# Altium footprint library Sensor.PcbLib: 18 footprints (part 1 of 2)
Each footprint in its own frame and in the unit in brackets; x right, y up, seen from the top. Pads: shape width x height; smd on the part's side, far side on the other; paste and mask are expansions set on the pad; w line width, h text height; cw(c..) or ccw(c..) is an arc to the next point about the centre after c.
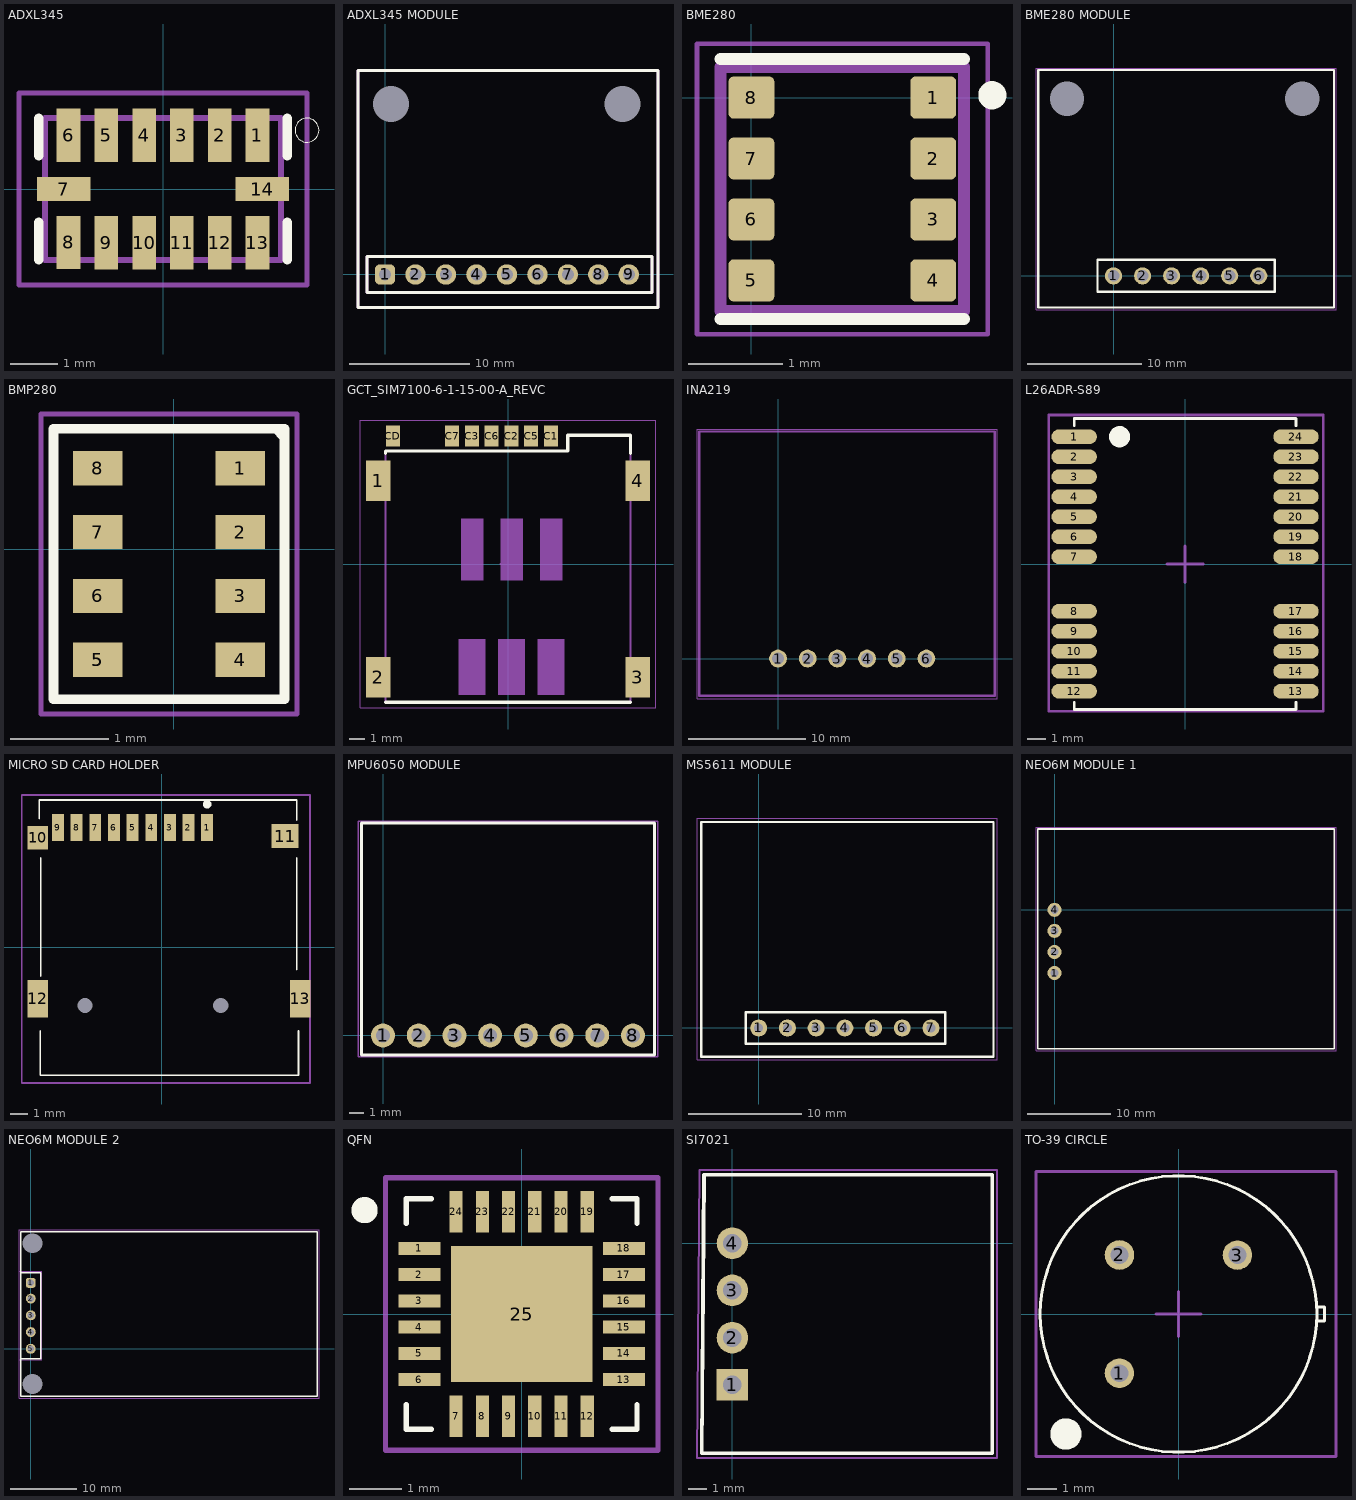
[diagram p0: the footprints below, top view; thin cyan lines are the x and y axes]

## ADXL345 [mm]
pads (14):
  rect 0.5x1.124 smd: 1(2,1.138) 2(1.2,1.138) 3(0.4,1.138) 4(-0.4,1.138) 5(-1.2,1.138) 6(-2,1.138) 8(-2,-1.13) 9(-1.2,-1.138) 10(-0.4,-1.138) 11(0.4,-1.138) 12(1.2,-1.138) 13(2,-1.138)
  rect 1.124x0.5 smd: 7(-2.1,0) 14(2.1,0)
Top Overlay:
  circle w0: c3.048,1.245 r0.254
  lines w0.203: -2.627,-1.5 -2.627,-0.7 ; -2.627,0.7 -2.627,1.5 ; 2.627,-1.5 2.627,-0.7 ; 2.627,0.7 2.627,1.5
Mechanical 3:
  lines w0.1: -3.048,-2.032 3.048,-2.032 3.048,2.032 -3.048,2.032 -3.048,-2.032
Mechanical 13:
  lines w0.127: -2.5,-1.5 2.5,-1.5 2.5,1.5 -2.5,1.5 -2.5,-1.5
3D body "User Library-ADXL345.step": height 1, standoff 0, extent -2.5,-1.5 2.5,1.5

## ADXL345 MODULE [mm]
pads (11):
  rrect50% 1.7x1.7 hole 1 mask+0.102: 1(0,0)
  round 1.7 hole 1 mask+0.102: 2(2.54,0) 3(5.08,0) 4(7.62,0) 5(10.16,0) 6(12.7,0) 7(15.24,0) 8(17.78,0) 9(20.32,0)
  round 0 hole 3 mask+0.102: ""(0.508,14.224) ""(19.812,14.224)
Top Overlay:
  lines w0.254: -2.25,-2.75 -2.25,17 22.75,17 22.75,-2.75 -2.25,-2.75 ; -1.5,-1.5 22.25,-1.5 22.25,1.5 -1.5,1.5 -1.5,-1.5
Mechanical 3:
  lines w0.254: -2.25,-2.75 -2.25,17 -2,17 22.75,17 22.75,-2.75 -2.25,-2.75 ; -1.5,-1.5 4.437,-1.5 16.312,-1.5 22.25,-1.5 22.25,1.5 16.312,1.5 13.344,1.5 11.859,1.5 8.891,1.5 7.406,1.5 4.437,1.5 -1.5,1.5 -1.5,-1.5
3D body "ADXL345 Digital Accelerometer.step": height 6.17, standoff -5.43, extent -1.905,-2.286 22.225,16.764

## BME280 [mm]
pads (8):
  rrect25% 0.49x0.45 smd: 1(1.94,0) 2(1.94,-0.65) 3(1.94,-1.3) 4(1.94,-1.95) 5(0,-1.95) 6(0,-1.3) 7(0,-0.65) 8(0,0)
Top Overlay:
  circle w0.2: c2.57,0.025 r0.05
  lines w0.127: -0.33,-2.36 2.27,-2.36 ; -0.33,0.41 2.27,0.41
Mechanical 13:
  circle w0.2: c1.97,0.025 r0.05
  lines w0.127: -0.33,-2.275 -0.33,0.325 2.27,0.325 2.27,-2.275 -0.33,-2.275
Mechanical 15:
  lines w0.05: -0.58,-2.525 2.52,-2.525 2.52,0.575 -0.58,0.575 -0.58,-2.525
3D body "User Library-BME280-1.step": height 0.93, standoff 0, extent -0.285,-2.241 2.215,0.259

## BME280 MODULE [mm]
pads (8):
  round 1.5 hole 1: 1(0,0) 2(2.54,0) 3(5.08,0) 4(7.62,0) 5(10.16,0) 6(12.7,0)
  round 0 hole 3 mask+0.102: ""(-4.064,15.494)
  round 2.5 hole 3 mask+0.102: ""(16.51,15.494)
Top Overlay:
  lines w0.2: -1.397,-1.397 -1.397,1.397 14.097,1.397 14.097,-1.397 -1.372,-1.397 ; -6.579,-2.769 -6.579,18 19.279,18 19.279,-2.769 -6.579,-2.769
Mechanical 3:
  lines w0.1: -6.782,-2.972 -6.782,18.161 19.456,18.161 19.456,-2.972 -6.782,-2.972
3D body "Adafruit BNO055 STEMMA QT.step": height 7.9, standoff 3.3, extent -6.35,-2.54 19.05,17.78
3D body "BPSC-06.stp": height 6, standoff -5.54, extent -1.27,-1.27 13.97,1.27

## BMP280 [mm]
pads (9):
  rect 0.5x0.35 smd: 1(0.675,0.825) 2(0.675,0.175) 3(0.675,-0.475) 4(0.675,-1.125) 5(-0.775,-1.125) 5(-0.775,-1.125) 6(-0.775,-0.475) 7(-0.775,0.175) 8(-0.775,0.825)
Top Overlay:
  region: 1.125,1.225 0.995,1.225 0.984,1.214 1.107,1.09 1.122,1.09
  region: 1.123,1.157 1.123,1.223 1.125,1.225
  lines w0.1: -1.225,-1.525 -1.225,1.225 1.125,1.225 1.125,-1.525 0.537,-1.525 -0.637,-1.525 -1.225,-1.525
Mechanical 15:
  lines w0.05: -1.35,-1.675 1.25,-1.675 1.25,1.375 -1.35,1.375 -1.35,-1.675
3D body "BMP280.step": height 0.95, standoff -0.01, extent -1.05,-1.4 0.95,1.1

## GCT_SIM7100-6-1-15-00-A_REVC [mm]
pads (11):
  rect 1.56x2.61 smd: 1(-8.34,5.34) 2(-8.34,-7.29) 3(8.34,-7.29) 4(8.34,5.34)
  rect 0.9x1.35 smd: C1(2.755,8.215) C2(0.215,8.215) C3(-2.325,8.215) C5(1.485,8.215) C6(-1.055,8.215) C7(-3.595,8.215) CD(-7.405,8.215)
Top Overlay:
  lines w0.2: -7.875,-8.89 7.875,-8.89 ; -7.875,7.1 -7.875,7.27 3.84,7.27 3.84,8.28 7.875,8.28 7.875,7.1
Mechanical 13:
  lines w0.1: -7.875,-8.89 -7.875,7.27 3.84,7.27 3.84,8.28 7.875,8.28 7.875,-8.89 -7.875,-8.89
Mechanical 15:
  region: 0.935,-1.03 -0.465,-1.03 -0.465,2.91 0.935,2.91
  region: 3.625,-8.41 1.925,-8.41 1.925,-4.83 3.625,-4.83
  region: 3.475,-1.03 2.075,-1.03 2.075,2.91 3.475,2.91
  region: 1.085,-8.41 -0.615,-8.41 -0.615,-4.83 1.085,-4.83
  region: -1.455,-8.41 -3.155,-8.41 -3.155,-4.83 -1.455,-4.83
  region: -1.605,-1.03 -3.005,-1.03 -3.005,2.91 -1.605,2.91
  lines w0.05: -9.5,-9.25 -9.5,9.25 9.5,9.25 9.5,-9.25 -9.5,-9.25
  lines w0.1: -0.5,0 0.5,0 ; 0,-0.5 0,0.5
3D body "SIM7100-6-1-15-00-A--3DModel-STEP-56544.STEP": height 1.5, standoff -0.03, extent -8.406,-8.989 8.344,8.341

## INA219 [mil]
pads (6):
  round 60 hole 39.37: 1(0,0) 2(100,0) 3(200,0) 4(300,0) 5(400,0) 6(500,0)
Mechanical 3:
  lines w3.94: -273,-135 -273,772 738,772 738,-135 -273,-135
  lines w7.87: -265,-126 -265,765 730,765 730,-126 -265,-126
3D body "INA219.STEP": height 266.44, standoff -196.15, extent -260.13,-119 724.13,758.95

## L26ADR-S89 [mm]
pads (24):
  oval 2.5x0.8 smd paste-2: 1(-6.1,7) 2(-6.1,5.9) 3(-6.1,4.8) 4(-6.1,3.7) 5(-6.1,2.6) 6(-6.1,1.5) 7(-6.1,0.4) 8(-6.1,-2.6) 9(-6.1,-3.7) 10(-6.1,-4.8) 11(-6.1,-5.9) 12(-6.1,-7) 13(6.1,-7) 14(6.1,-5.9) 15(6.1,-4.8) 16(6.1,-3.7) 17(6.1,-2.6) 18(6.1,0.4) 19(6.1,1.5) 20(6.1,2.6) 21(6.1,3.7) 22(6.1,4.8) 23(6.1,5.9) 24(6.1,7)
Top Overlay:
  circle w0.6: c-3.6,7 r0.283
  lines w0.15: -6.1,-7.6 -6.1,-8 6.1,-8 6.1,-7.6 ; -6.1,7.6 -6.1,8 6.1,8 6.1,7.6
Top Component Center:
  lines w0.15: -1,0 1,0 ; 0,-1.016 0,0.984 ; -7.5,-8.1 7.6,-8.1 7.6,8.2 -7.5,8.2 -7.5,-8.1
Mechanical 15:
  lines w0.15: -7.5,-8.1 7.6,-8.1 7.6,8.2 -7.5,8.2 -7.5,-8.1
3D body "step_temp.STEP": height 2.35, standoff -0.05, extent -6.085,-7.995 6.115,8.005

## MICRO SD CARD HOLDER [mm]
pads (15):
  rect 0.7x1.6 smd paste+0 mask+0: 1(2.684,7.075) 2(1.584,7.075) 3(0.484,7.075) 4(-0.616,7.075) 5(-1.716,7.075) 6(-2.816,7.075) 7(-3.916,7.075) 8(-5.016,7.075) 9(-6.116,7.075)
  rect 1.2x1.4 smd paste+0 mask+0: 10(-7.316,6.475)
  rect 1.6x1.4 smd paste+0 mask+0: 11(7.284,6.575)
  rect 1.2x2.2 smd paste+0 mask+0: 12(-7.316,-3.025) 13(8.184,-3.025)
  round 0 hole 0.9 unplated paste-1000 mask+0: ""(-4.516,-3.425) ""(3.484,-3.425)
Top Overlay:
  circle w0.25: c2.684,8.45 r0.125
  lines w0.1: -7.225,7.6 -7.225,8.7 7.975,8.7 7.975,7.5 ; -7.157,-4.925 -7.157,-7.548 8.075,-7.548 8.075,-4.925 ; -7.125,-1.7 -7.125,5.3 ; 7.975,-1.3 7.975,5.3
Mechanical 3:
  lines w0.1: -8.25,-8 -8.25,9 -7.75,9 8.5,9 8.75,9 8.75,-8 -8.25,-8
3D body "User Library-MEM2055-00-190-01-A_revG.step": height 1.85, standoff -0.6, extent -7.567,-7.42 8.433,7.83

## MPU6050 MODULE [mm]
pads (8):
  round 1.7 hole 1 mask+0.102: 1(0,0) 2(2.54,0) 3(5.08,0) 4(7.62,0) 5(10.16,0) 6(12.7,0) 7(15.24,0) 8(17.78,0)
Top Overlay:
  lines w0.2: -1.524,-1.397 19.304,-1.397 19.304,15.113 -1.524,15.113 -1.524,-1.397
Mechanical 15:
  lines w0.1: -1.778,-1.524 19.558,-1.524 19.558,15.24 -1.778,15.24 -1.778,-1.524
3D body "Pin Header 1x8 TH Pitch 2.54mm.stp": height 6.5, standoff -6.2, extent -1.259,-1.237 19.061,1.303
3D body "MPU_6050.step": height -2.7, standoff -5.7, extent -1.384,-1.003 19.116,14.997

## MS5611 MODULE [mm]
pads (7):
  round 1.5 hole 0.8: 1(0,0) 2(2.54,0) 3(5.08,0) 4(7.62,0) 5(10.16,0) 6(12.7,0) 7(15.24,0)
Top Overlay:
  lines w0.2: -1.143,-1.397 -1.143,1.397 16.51,1.397 16.51,-1.397 -1.118,-1.397 ; -5.08,-2.54 20.777,-2.54 20.777,18.229 -5.08,18.229 -5.08,-2.54
Mechanical 3:
  lines w0.1: -5.461,-2.794 21.082,-2.794 21.082,18.542 -5.461,18.542 -5.461,-2.794
3D body: height 13.8, standoff 0, extent 25.4,12.7 25.4,12.7
3D body: height 13.8, standoff 0, extent 3.556,12.192 3.556,12.192
3D body: height 0, standoff 0, extent 35.458,5.791 35.458,5.791
3D body "7x_Male_Pin_2.54_mm.STEP": height 5.54, standoff -5.56, extent -1.168,-1.219 16.612,1.181

## NEO6M MODULE 1 [mm]
pads (4):
  round 1.7 hole 1 mask+0.102: 1(0,-7.62) 2(0,-5.08) 3(0,-2.54) 4(0,0)
Top Overlay:
  lines w0.2: -2.007,-16.764 -2.007,9.754 33.706,9.754 33.706,-16.764 -2.007,-16.764
Mechanical 3:
  lines w0.1: -2.235,-16.993 -2.235,9.957 33.934,9.957 33.934,-16.993 -2.235,-16.993
3D body "User Library-User Library-GY-GPS6MV2 v1.step": height 6.57, standoff -3.43, extent -1.873,-16.616 33.527,9.584

## NEO6M MODULE 2 [mm]
pads (7):
  rrect50% 1.5x1.5 hole 1: 1(0,10)
  round 1.5 hole 1: 2(0.016,7.62) 3(0.016,5.08) 4(0.016,2.54) 5(0,0)
  round 0 hole 3: ""(0.254,-5.334) ""(0.254,16.002)
Top Overlay:
  lines w0.2: -1.524,11.557 1.516,11.557 1.516,-1.5 -1.484,-1.5 ; -1.524,-7.22 43.476,-7.22 43.476,17.78 -1.524,17.78 -1.524,-7.22
Mechanical 3:
  lines w0.1: -1.778,11.735 1.702,11.735 1.702,-1.676 -1.753,-1.676 ; -1.774,-7.47 43.726,-7.47 43.726,18.03 -1.774,18.03 -1.774,-7.47
3D body "HDR1X5.STEP": height 9.05, standoff -2.95, extent -1.254,-1.27 1.286,11.43

## QFN [mm] "QFN, 24-Leads, Body 4,00x4,00mm, Pitch 0,50mm, Thermal Pad 2,70x2,60mm, IPC Medium Density"
height 0.95
pads (25):
  rect 0.8x0.25 smd mask+0.05: 1(-1.95,1.25) 2(-1.95,0.75) 3(-1.95,0.25) 4(-1.95,-0.25) 5(-1.95,-0.75) 6(-1.95,-1.25) 13(1.95,-1.25) 14(1.95,-0.75) 15(1.95,-0.25) 16(1.95,0.25) 17(1.95,0.75) 18(1.95,1.25)
  rect 0.25x0.8 smd mask+0.05: 7(-1.25,-1.95) 8(-0.75,-1.95) 9(-0.25,-1.95) 10(0.25,-1.95) 11(0.75,-1.95) 12(1.25,-1.95) 19(1.25,1.95) 20(0.75,1.95) 21(0.25,1.95) 22(-0.25,1.95) 23(-0.75,1.95) 24(-1.25,1.95)
  rect 2.7x2.6 smd mask+0.05: 25(0,0)
Top Overlay:
  circle w0.25: c-2.997,1.981 r0.125
  lines w0.1: -2.2,-1.725 -2.2,-2.2 -1.725,-2.2 ; -2.2,1.725 -2.2,2.2 -1.725,2.2 ; 1.725,-2.2 2.2,-2.2 2.2,-1.725 ; 1.725,2.2 2.2,2.2 2.2,1.725
Mechanical 15:
  lines w0.1: -0.5,0 0.5,0 ; 0,-0.5 0,0.5 ; -2.6,-2.6 2.6,-2.6 2.6,2.6 -2.6,2.6 -2.6,-2.6
3D body "QFN.step": height 0.95, standoff 0, extent -2.07,-2.07 2.07,2.07

## SI7021 [mm]
pads (4):
  rect 1.7x1.7 hole 1: 1(0,-7.62)
  round 1.7 hole 1: 2(0,-5.08) 3(0,-2.54) 4(0,0)
Top Overlay:
  lines w0.2: -1.651,-11.303 13.97,-11.303 13.97,3.683 -1.524,3.683 -1.651,-11.303
Mechanical 15:
  lines w0.1: -1.905,-11.557 -1.778,3.937 14.224,3.937 14.224,-11.557 -1.905,-11.557
3D body "SI7021.stp": height 6.01, standoff -5.24, extent -1.535,-11.293 13.965,3.707

## TO-39 CIRCLE [mm] "GAS DETECTOR"
pads (3):
  round 1 hole 0.6 mask+0.102: 1(-2.001,-2.004) 2(-1.999,1.998) 3(1.996,1.995)
Top Overlay:
  circle w0.1: c0,0 r4.684
  circle w0.55: c-3.81,-4.064 r0.254
  lines w0.1: 4.686,0.242 4.946,0.242 4.946,-0.237 4.688,-0.237
Mechanical 15:
  lines w0.1: -0.762,0 0.762,0 ; 0,-0.762 0,0.762 ; -4.826,-4.826 -4.826,4.826 5.334,4.826 5.334,-4.826 -4.826,-4.826
3D body "USEQGCCAS82100.step": height 4.25, standoff -14.4, extent -4.595,-4.595 4.972,4.595